# Altium footprint library mobinbyn-Header.PcbLib: 297 footprints (part 11 of 23)
Each footprint in its own frame and in the unit in brackets; x right, y up, seen from the top. Pads: shape width x height; smd on the part's side, far side on the other; paste and mask are expansions set on the pad; w line width, h text height; cw(c..) or ccw(c..) is an arc to the next point about the centre after c.
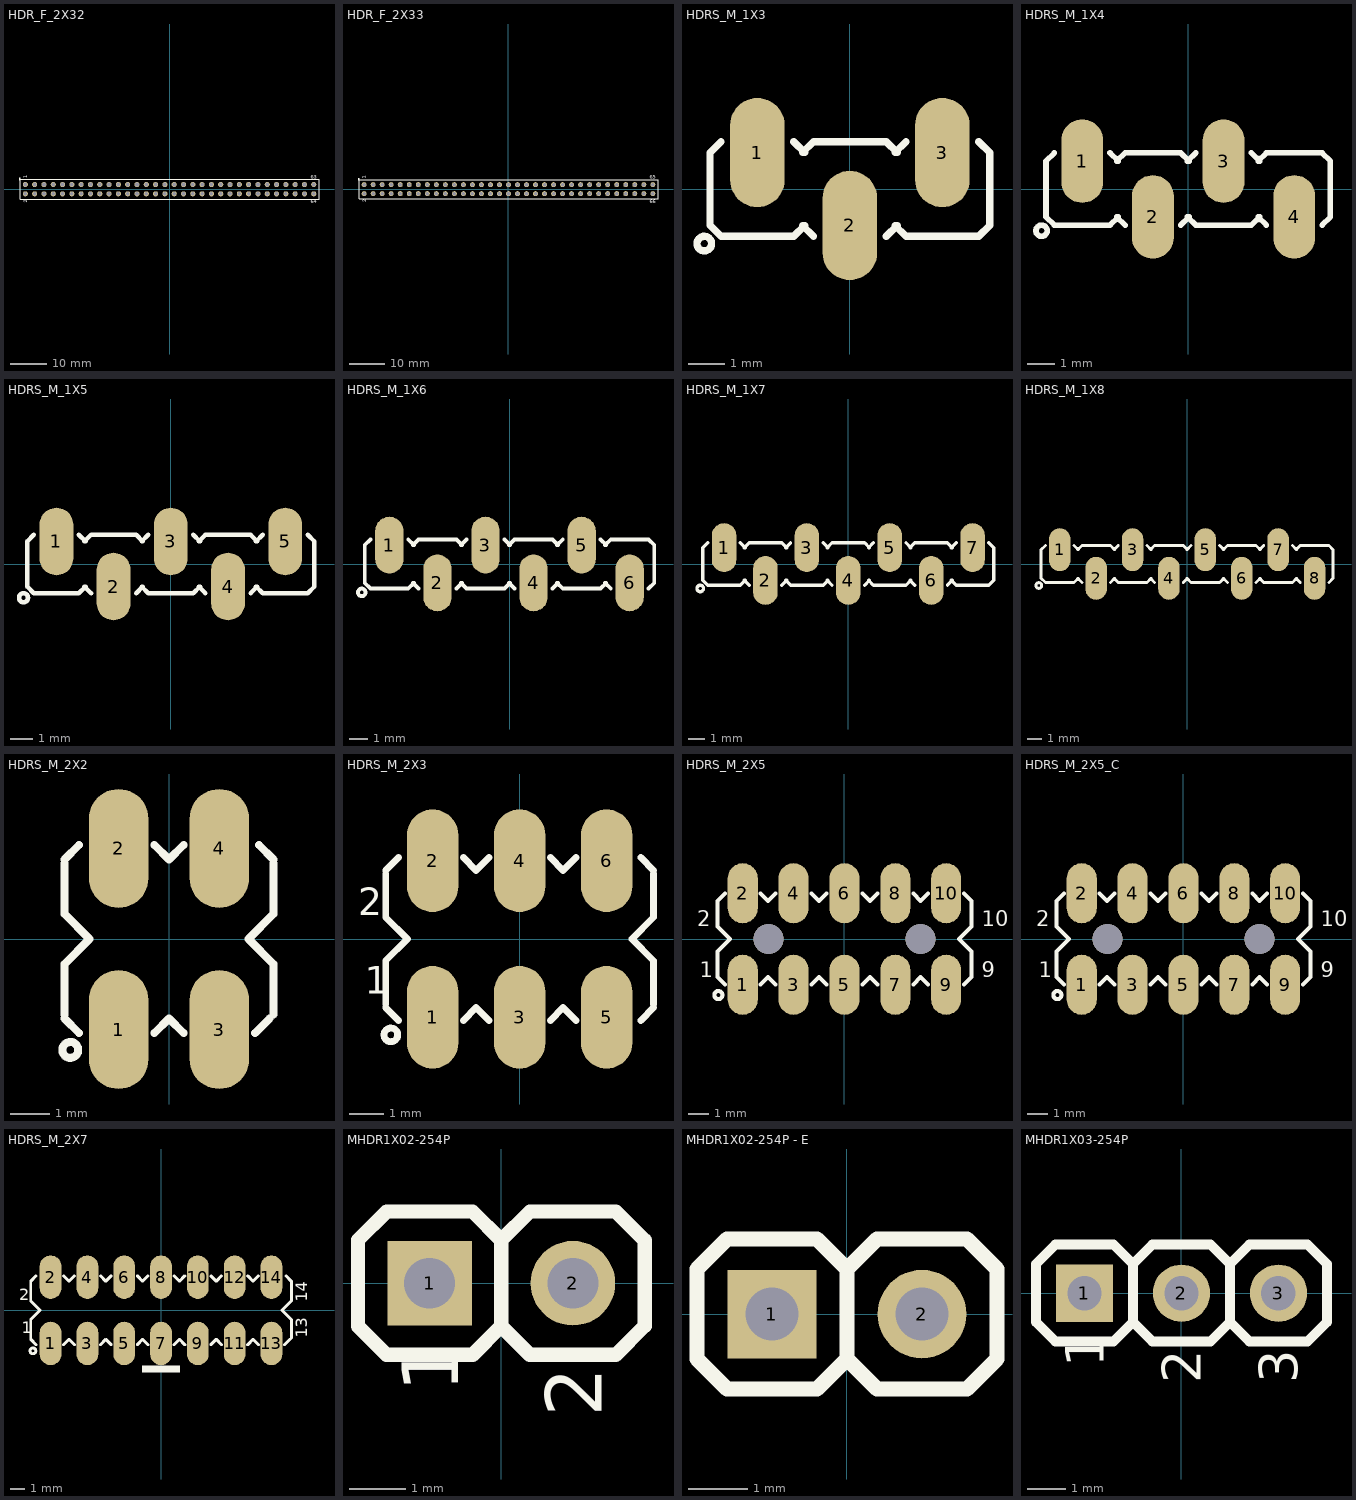
[diagram p10: the footprints below, top view; thin cyan lines are the x and y axes]

## HDR_F_2X32 [mm] "Male Header 2X32 with 2.54 mm Pitch"
pads (64):
  round 1.4 / inner round 1.4 / far side oval 1.4x2.2 hole 1: 1(-39.37,1.27) 2(-39.37,-1.27) 3(-36.83,1.27) 4(-36.83,-1.27) 5(-34.29,1.27) 6(-34.29,-1.27) 7(-31.75,1.27) 8(-31.75,-1.27) 9(-29.21,1.27) 10(-29.21,-1.27) 11(-26.67,1.27) 12(-26.67,-1.27) 13(-24.13,1.27) 14(-24.13,-1.27) 15(-21.59,1.27) 16(-21.59,-1.27) 17(-19.05,1.27) 18(-19.05,-1.27) 19(-16.51,1.27) 20(-16.51,-1.27) 21(-13.97,1.27) 22(-13.97,-1.27) 23(-11.43,1.27) 24(-11.43,-1.27) 25(-8.89,1.27) 26(-8.89,-1.27) 27(-6.35,1.27) 28(-6.35,-1.27) 29(-3.81,1.27) 30(-3.81,-1.27) 31(-1.27,1.27) 32(-1.27,-1.27) 33(1.27,1.27) 34(1.27,-1.27) 35(3.81,1.27) 36(3.81,-1.27) 37(6.35,1.27) 38(6.35,-1.27) 39(8.89,1.27) 40(8.89,-1.27) 41(11.43,1.27) 42(11.43,-1.27) 43(13.97,1.27) 44(13.97,-1.27) 45(16.51,1.27) 46(16.51,-1.27) 47(19.05,1.27) 48(19.05,-1.27) 49(21.59,1.27) 50(21.59,-1.27) 51(24.13,1.27) 52(24.13,-1.27) 53(26.67,1.27) 54(26.67,-1.27) 55(29.21,1.27) 56(29.21,-1.27) 57(31.75,1.27) 58(31.75,-1.27) 59(34.29,1.27) 60(34.29,-1.27) 61(36.83,1.27) 62(36.83,-1.27) 63(39.37,1.27) 64(39.37,-1.27)
Top Overlay:
  circle w0.2: c-40.9,2.8 r0.2
  lines w0.2: -40.8,-2.7 40.8,-2.7 40.8,2.7 -40.8,2.7 -40.8,-2.7
  text "2" at -38.8,-3.7 h1
  text "1" at -38.9,3 h1
  text "64" at 38.6,-3.9 h1
  text "63" at 38.6,2.9 h1
3D body "PBD-2.stp": height 8.5, standoff -3.15, extent 38.1,-2.54 40.64,2.54
3D body "PBD-2.stp": height 8.5, standoff -3.15, extent 33.02,-2.54 35.56,2.54
3D body "PBD-2.stp": height 8.5, standoff -3.15, extent 30.48,-2.54 33.02,2.54
3D body "PBD-2.stp": height 8.5, standoff -3.15, extent 35.56,-2.54 38.1,2.54
3D body "PBD-2.stp": height 8.5, standoff -3.15, extent 25.4,-2.54 27.94,2.54
3D body "PBD-2.stp": height 8.5, standoff -3.15, extent 22.86,-2.54 25.4,2.54
3D body "PBD-2.stp": height 8.5, standoff -3.15, extent 27.94,-2.54 30.48,2.54
3D body "PBD-2.stp": height 8.5, standoff -3.15, extent 20.32,-2.54 22.86,2.54
3D body "PBD-2.stp": height 8.5, standoff -3.15, extent 17.78,-2.54 20.32,2.54
3D body "PBD-2.stp": height 8.5, standoff -3.15, extent 15.24,-2.54 17.78,2.54
3D body "PBD-2.stp": height 8.5, standoff -3.15, extent 12.7,-2.54 15.24,2.54
3D body "PBD-2.stp": height 8.5, standoff -3.15, extent 10.16,-2.54 12.7,2.54
3D body "PBD-2.stp": height 8.5, standoff -3.15, extent 7.62,-2.54 10.16,2.54
3D body "PBD-2.stp": height 8.5, standoff -3.15, extent 5.08,-2.54 7.62,2.54
3D body "PBD-2.stp": height 8.5, standoff -3.15, extent 0,-2.54 2.54,2.54
3D body "PBD-2.stp": height 8.5, standoff -3.15, extent -2.54,-2.54 0,2.54
3D body "PBD-2.stp": height 8.5, standoff -3.15, extent 2.54,-2.54 5.08,2.54
3D body "PBD-2.stp": height 8.5, standoff -3.15, extent -7.62,-2.54 -5.08,2.54
3D body "PBD-2.stp": height 8.5, standoff -3.15, extent -10.16,-2.54 -7.62,2.54
3D body "PBD-2.stp": height 8.5, standoff -3.15, extent -5.08,-2.54 -2.54,2.54
3D body "PBD-2.stp": height 8.5, standoff -3.15, extent -15.24,-2.54 -12.7,2.54
3D body "PBD-2.stp": height 8.5, standoff -3.15, extent -17.78,-2.54 -15.24,2.54
3D body "PBD-2.stp": height 8.5, standoff -3.15, extent -12.7,-2.54 -10.16,2.54
3D body "PBD-2.stp": height 8.5, standoff -3.15, extent -22.86,-2.54 -20.32,2.54
3D body "PBD-2.stp": height 8.5, standoff -3.15, extent -25.4,-2.54 -22.86,2.54
3D body "PBD-2.stp": height 8.5, standoff -3.15, extent -20.32,-2.54 -17.78,2.54
3D body "PBD-2.stp": height 8.5, standoff -3.15, extent -30.48,-2.54 -27.94,2.54
3D body "PBD-2.stp": height 8.5, standoff -3.15, extent -33.02,-2.54 -30.48,2.54
3D body "PBD-2.stp": height 8.5, standoff -3.15, extent -27.94,-2.54 -25.4,2.54
3D body "PBD-2.stp": height 8.5, standoff -3.15, extent -38.1,-2.54 -35.56,2.54
3D body "PBD-2.stp": height 8.5, standoff -3.15, extent -40.64,-2.54 -38.1,2.54
3D body "PBD-2.stp": height 8.5, standoff -3.15, extent -35.56,-2.54 -33.02,2.54

## HDR_F_2X33 [mm] "Male Header 2X32 with 2.54 mm Pitch"
pads (66):
  round 1.4 / inner round 1.4 / far side oval 1.4x2.2 hole 1: 1(-40.64,1.27) 2(-40.64,-1.27) 3(-38.1,1.27) 4(-38.1,-1.27) 5(-35.56,1.27) 6(-35.56,-1.27) 7(-33.02,1.27) 8(-33.02,-1.27) 9(-30.48,1.27) 10(-30.48,-1.27) 11(-27.94,1.27) 12(-27.94,-1.27) 13(-25.4,1.27) 14(-25.4,-1.27) 15(-22.86,1.27) 16(-22.86,-1.27) 17(-20.32,1.27) 18(-20.32,-1.27) 19(-17.78,1.27) 20(-17.78,-1.27) 21(-15.24,1.27) 22(-15.24,-1.27) 23(-12.7,1.27) 24(-12.7,-1.27) 25(-10.16,1.27) 26(-10.16,-1.27) 27(-7.62,1.27) 28(-7.62,-1.27) 29(-5.08,1.27) 30(-5.08,-1.27) 31(-2.54,1.27) 32(-2.54,-1.27) 33(0,1.27) 34(0,-1.27) 35(2.54,1.27) 36(2.54,-1.27) 37(5.08,1.27) 38(5.08,-1.27) 39(7.62,1.27) 40(7.62,-1.27) 41(10.16,1.27) 42(10.16,-1.27) 43(12.7,1.27) 44(12.7,-1.27) 45(15.24,1.27) 46(15.24,-1.27) 47(17.78,1.27) 48(17.78,-1.27) 49(20.32,1.27) 50(20.32,-1.27) 51(22.86,1.27) 52(22.86,-1.27) 53(25.4,1.27) 54(25.4,-1.27) 55(27.94,1.27) 56(27.94,-1.27) 57(30.48,1.27) 58(30.48,-1.27) 59(33.02,1.27) 60(33.02,-1.27) 61(35.56,1.27) 62(35.56,-1.27) 63(38.1,1.27) 64(38.1,-1.27) 65(40.64,1.27) 66(40.64,-1.27)
Top Overlay:
  circle w0.2: c-42.17,2.8 r0.2
  lines w0.2: -42.07,-2.7 -42.07,2.7 42.1,2.7 42.1,-2.7 -42.07,-2.7
  text "65" at 39.83,2.9 h1
  text "66" at 39.83,-3.9 h1
  text "1" at -40.17,3 h1
  text "2" at -40.07,-3.7 h1
3D body "PBD-2.stp": height 8.5, standoff -3.15, extent 39.37,-2.54 41.91,2.54
3D body "PBD-2.stp": height 8.5, standoff -3.15, extent 6.35,-2.54 8.89,2.54
3D body "PBD-2.stp": height 8.5, standoff -3.15, extent 13.97,-2.54 16.51,2.54
3D body "PBD-2.stp": height 8.5, standoff -3.15, extent 21.59,-2.54 24.13,2.54
3D body "PBD-2.stp": height 8.5, standoff -3.15, extent 29.21,-2.54 31.75,2.54
3D body "PBD-2.stp": height 8.5, standoff -3.15, extent -26.67,-2.54 -24.13,2.54
3D body "PBD-2.stp": height 8.5, standoff -3.15, extent -19.05,-2.54 -16.51,2.54
3D body "PBD-2.stp": height 8.5, standoff -3.15, extent -11.43,-2.54 -8.89,2.54
3D body "PBD-2.stp": height 8.5, standoff -3.15, extent -1.27,-2.54 1.27,2.54
3D body "PBD-2.stp": height 8.5, standoff -3.15, extent -41.91,-2.54 -39.37,2.54
3D body "PBD-2.stp": height 8.5, standoff -3.15, extent -34.29,-2.54 -31.75,2.54
3D body "PBD-2.stp": height 8.5, standoff -3.15, extent 34.29,-2.54 36.83,2.54
3D body "PBD-2.stp": height 8.5, standoff -3.15, extent 31.75,-2.54 34.29,2.54
3D body "PBD-2.stp": height 8.5, standoff -3.15, extent 36.83,-2.54 39.37,2.54
3D body "PBD-2.stp": height 8.5, standoff -3.15, extent 26.67,-2.54 29.21,2.54
3D body "PBD-2.stp": height 8.5, standoff -3.15, extent 24.13,-2.54 26.67,2.54
3D body "PBD-2.stp": height 8.5, standoff -3.15, extent 16.51,-2.54 19.05,2.54
3D body "PBD-2.stp": height 8.5, standoff -3.15, extent 19.05,-2.54 21.59,2.54
3D body "PBD-2.stp": height 8.5, standoff -3.15, extent 8.89,-2.54 11.43,2.54
3D body "PBD-2.stp": height 8.5, standoff -3.15, extent 11.43,-2.54 13.97,2.54
3D body "PBD-2.stp": height 8.5, standoff -3.15, extent 1.27,-2.54 3.81,2.54
3D body "PBD-2.stp": height 8.5, standoff -3.15, extent 3.81,-2.54 6.35,2.54
3D body "PBD-2.stp": height 8.5, standoff -3.15, extent -6.35,-2.54 -3.81,2.54
3D body "PBD-2.stp": height 8.5, standoff -3.15, extent -8.89,-2.54 -6.35,2.54
3D body "PBD-2.stp": height 8.5, standoff -3.15, extent -3.81,-2.54 -1.27,2.54
3D body "PBD-2.stp": height 8.5, standoff -3.15, extent -13.97,-2.54 -11.43,2.54
3D body "PBD-2.stp": height 8.5, standoff -3.15, extent -16.51,-2.54 -13.97,2.54
3D body "PBD-2.stp": height 8.5, standoff -3.15, extent -21.59,-2.54 -19.05,2.54
3D body "PBD-2.stp": height 8.5, standoff -3.15, extent -24.13,-2.54 -21.59,2.54
3D body "PBD-2.stp": height 8.5, standoff -3.15, extent -29.21,-2.54 -26.67,2.54
3D body "PBD-2.stp": height 8.5, standoff -3.15, extent -31.75,-2.54 -29.21,2.54
3D body "PBD-2.stp": height 8.5, standoff -3.15, extent -36.83,-2.54 -34.29,2.54
3D body "PBD-2.stp": height 8.5, standoff -3.15, extent -39.37,-2.54 -36.83,2.54

## HDRS_M_1X3 [mm] "Connector; Header; 3 Position, SMD"
pads (3):
  oval 1.5x3 smd: 1(-2.54,1) 2(0,-1) 3(2.54,1)
Top Overlay:
  circle w0.2: c-4,-1.5 r0.2
  lines w0.2: -3.54,1.3 -3.84,1 -3.84,-1 -3.54,-1.3 -1.54,-1.3 -1.24,-1 ; -1.54,1.3 -1.24,1 ; -1.3,-1 -1,-1.3 ; -1.3,1 -1,1.3 1,1.3 1.3,1 ; 1,-1.3 1.3,-1 ; 1.24,-1 1.54,-1.3 3.54,-1.3 3.84,-1 3.84,1 3.54,1.3 ; 1.24,1 1.54,1.3
3D body "HEADER1X3SMD.stp": height 9.68, standoff 0.03, extent -3.81,-2.4 3.81,2.4

## HDRS_M_1X4 [mm] "Connector; Header; 4 Position, SMD"
pads (4):
  oval 1.5x3 smd: 1(-3.81,1) 2(-1.27,-1) 3(1.27,1) 4(3.81,-1)
Top Overlay:
  circle w0.2: c-5.27,-1.5 r0.2
  lines w0.2: -4.81,1.3 -5.11,1 -5.11,-1 -4.81,-1.3 -2.81,-1.3 -2.51,-1 ; -2.81,1.3 -2.51,1 ; -2.57,-1 -2.27,-1.3 ; -2.57,1 -2.27,1.3 -0.27,1.3 0.03,1 ; -0.27,-1.3 0.03,-1 ; -0.03,-1 0.27,-1.3 2.27,-1.3 2.57,-1 ; -0.03,1 0.27,1.3 ; 2.27,1.3 2.57,1 ; 2.51,-1 2.81,-1.3 ; 2.51,1 2.81,1.3 4.81,1.3 5.11,1 5.11,-1 4.81,-1.3
3D body "HEADER1X3SMD.stp": height 9.68, standoff 0.03, extent -5.08,-2.4 2.54,2.4
3D body "HEADER1X3SMD.stp": height 9.68, standoff 0.03, extent -2.54,-2.4 5.08,2.4

## HDRS_M_1X5 [mm] "Connector; Header; 5 Position, SMD"
pads (5):
  oval 1.5x3 smd: 1(-5.08,1) 2(-2.54,-1) 3(0,1) 4(2.54,-1) 5(5.08,1)
Top Overlay:
  circle w0.2: c-6.54,-1.5 r0.2
  lines w0.2: -6.08,1.3 -6.38,1 -6.38,-1 -6.08,-1.3 -4.08,-1.3 -3.78,-1 ; -4.08,1.3 -3.78,1 ; -3.84,-1 -3.54,-1.3 ; -3.84,1 -3.54,1.3 -1.54,1.3 -1.24,1 ; -1.54,-1.3 -1.24,-1 ; -1.3,-1 -1,-1.3 1,-1.3 1.3,-1 ; -1.3,1 -1,1.3 ; 1,1.3 1.3,1 ; 1.24,-1 1.54,-1.3 ; 1.24,1 1.54,1.3 3.54,1.3 3.84,1 ; 3.54,-1.3 3.84,-1 ; 3.78,-1 4.08,-1.3 6.08,-1.3 6.38,-1 6.38,1 6.08,1.3 ; 3.78,1 4.08,1.3
3D body "HEADER1X3SMD.stp": height 9.68, standoff 0.03, extent -3.81,-2.4 3.81,2.4
3D body "HEADER1X3SMD.stp": height 9.68, standoff 0.03, extent -1.27,-2.4 6.35,2.4
3D body "HEADER1X3SMD.stp": height 9.68, standoff 0.03, extent -6.35,-2.4 1.27,2.4

## HDRS_M_1X6 [mm] "Connector; Header; 6 Position, SMD"
pads (6):
  oval 1.5x3 smd: 1(-6.35,1) 2(-3.81,-1) 3(-1.27,1) 4(1.27,-1) 5(3.81,1) 6(6.35,-1)
Top Overlay:
  circle w0.2: c-7.81,-1.5 r0.2
  lines w0.2: -7.35,1.3 -7.65,1 -7.65,-1 -7.35,-1.3 -5.35,-1.3 -5.05,-1 ; -5.35,1.3 -5.05,1 ; -5.11,-1 -4.81,-1.3 ; -5.11,1 -4.81,1.3 -2.81,1.3 -2.51,1 ; -2.81,-1.3 -2.51,-1 ; -2.57,-1 -2.27,-1.3 -0.27,-1.3 0.03,-1 ; -2.57,1 -2.27,1.3 ; -0.27,1.3 0.03,1 ; -0.03,-1 0.27,-1.3 ; -0.03,1 0.27,1.3 2.27,1.3 2.57,1 ; 2.27,-1.3 2.57,-1 ; 2.51,-1 2.81,-1.3 4.81,-1.3 5.11,-1 ; 2.51,1 2.81,1.3 ; 4.81,1.3 5.11,1 ; 5.05,-1 5.35,-1.3 ; 5.05,1 5.35,1.3 7.35,1.3 7.65,1 7.65,-1 7.35,-1.3
3D body "HEADER1X3SMD.stp": height 9.68, standoff 0.03, extent 0,-2.4 7.62,2.4
3D body "HEADER1X3SMD.stp": height 9.68, standoff 0.03, extent -7.62,-2.4 0,2.4

## HDRS_M_1X7 [mm] "Connector; Header; 7 Position, SMD"
pads (7):
  oval 1.5x3 smd: 1(-7.62,1) 2(-5.08,-1) 3(-2.54,1) 4(0,-1) 5(2.54,1) 6(5.08,-1) 7(7.62,1)
Top Overlay:
  circle w0.2: c-9.08,-1.5 r0.2
  lines w0.2: -8.62,1.3 -8.92,1 -8.92,-1 -8.62,-1.3 -6.62,-1.3 -6.32,-1 ; -6.62,1.3 -6.32,1 ; -6.38,-1 -6.08,-1.3 ; -6.38,1 -6.08,1.3 -4.08,1.3 -3.78,1 ; -4.08,-1.3 -3.78,-1 ; -3.84,-1 -3.54,-1.3 -1.54,-1.3 -1.24,-1 ; -3.84,1 -3.54,1.3 ; -1.54,1.3 -1.24,1 ; -1.3,-1 -1,-1.3 ; -1.3,1 -1,1.3 1,1.3 1.3,1 ; 1,-1.3 1.3,-1 ; 1.24,-1 1.54,-1.3 3.54,-1.3 3.84,-1 ; 1.24,1 1.54,1.3 ; 3.54,1.3 3.84,1 ; 3.78,-1 4.08,-1.3 ; 3.78,1 4.08,1.3 6.08,1.3 6.38,1 ; 6.08,-1.3 6.38,-1 ; 6.32,-1 6.62,-1.3 8.62,-1.3 8.92,-1 8.92,1 8.62,1.3 ; 6.32,1 6.62,1.3
3D body "HEADER1X3SMD.stp": height 9.68, standoff 0.03, extent -1.27,-2.4 6.35,2.4
3D body "HEADER1X3SMD.stp": height 9.68, standoff 0.03, extent 1.27,-2.4 8.89,2.4
3D body "HEADER1X3SMD.stp": height 9.68, standoff 0.03, extent -8.89,-2.4 -1.27,2.4

## HDRS_M_1X8 [mm] "Connector; Header; 8 Position, SMD"
pads (8):
  oval 1.5x3 smd: 1(-8.89,1) 2(-6.35,-1) 3(-3.81,1) 4(-1.27,-1) 5(1.27,1) 6(3.81,-1) 7(6.35,1) 8(8.89,-1)
Top Overlay:
  circle w0.2: c-10.35,-1.5 r0.2
  lines w0.2: -9.89,1.3 -10.19,1 -10.19,-1 -9.89,-1.3 -7.89,-1.3 -7.59,-1 ; -7.89,1.3 -7.59,1 ; -7.65,-1 -7.35,-1.3 ; -7.65,1 -7.35,1.3 -5.35,1.3 -5.05,1 ; -5.35,-1.3 -5.05,-1 ; -5.11,-1 -4.81,-1.3 -2.81,-1.3 -2.51,-1 ; -5.11,1 -4.81,1.3 ; -2.81,1.3 -2.51,1 ; -2.57,-1 -2.27,-1.3 ; -2.57,1 -2.27,1.3 -0.27,1.3 0.03,1 ; -0.27,-1.3 0.03,-1 ; -0.03,-1 0.27,-1.3 2.27,-1.3 2.57,-1 ; -0.03,1 0.27,1.3 ; 2.27,1.3 2.57,1 ; 2.51,-1 2.81,-1.3 ; 2.51,1 2.81,1.3 4.81,1.3 5.11,1 ; 4.81,-1.3 5.11,-1 ; 5.05,-1 5.35,-1.3 7.35,-1.3 7.65,-1 ; 5.05,1 5.35,1.3 ; 7.35,1.3 7.65,1 ; 7.59,-1 7.89,-1.3 ; 7.59,1 7.89,1.3 9.89,1.3 10.19,1 10.19,-1 9.89,-1.3
3D body "HEADER1X3SMD.stp": height 9.68, standoff 0.03, extent 2.54,-2.4 10.16,2.4
3D body "HEADER1X3SMD.stp": height 9.68, standoff 0.03, extent 0,-2.4 7.62,2.4
3D body "HEADER1X3SMD.stp": height 9.68, standoff 0.03, extent -7.62,-2.4 0,2.4
3D body "HEADER1X3SMD.stp": height 9.68, standoff 0.03, extent -10.16,-2.4 -2.54,2.4

## HDRS_M_2X2 [mm]
pads (4):
  oval 1.5x3 smd: 1(-1.27,-2.286) 2(-1.27,2.286) 3(1.27,-2.286) 4(1.27,2.286)
Top Overlay:
  circle w0.2: c-2.49,-2.8 r0.2
  lines w0.2: -2.64,-2.005 -2.267,-2.378 ; -2.64,-1.905 -2.64,-0.635 -2.005,0 -2.64,0.635 -2.64,1.905 ; -2.64,2.005 -2.267,2.378 ; -0.373,-2.378 0,-2.005 0.373,-2.378 ; -0.373,2.378 0,2.005 0.373,2.378 ; 2.167,-2.378 2.54,-2.005 ; 2.267,2.378 2.64,2.005 ; 2.64,-1.905 2.64,-0.635 2.005,0 2.64,0.635 2.64,1.905
3D body "HEADER2X2SMD.stp": height 9.54, standoff -0.11, extent -2.54,-3.492 2.54,3.493

## HDRS_M_2X3 [mm] "Connector; Header; 3x2 Position, SMD"
pads (6):
  oval 1.5x3 smd: 1(-2.54,-2.286) 2(-2.54,2.286) 3(0,-2.286) 4(0,2.286) 5(2.54,-2.286) 6(2.54,2.286)
Top Overlay:
  circle w0.2: c-3.76,-2.8 r0.2
  lines w0.2: -3.91,-2.005 -3.537,-2.378 ; -3.91,-1.905 -3.91,-0.635 -3.275,0 -3.91,0.635 -3.91,1.905 ; -3.91,2.005 -3.537,2.378 ; -1.643,-2.378 -1.27,-2.005 -0.897,-2.378 ; -1.643,2.378 -1.27,2.005 -0.897,2.378 ; 0.897,-2.378 1.27,-2.005 1.643,-2.378 ; 0.897,2.378 1.27,2.005 1.643,2.378 ; 3.537,-2.378 3.91,-2.005 ; 3.537,2.378 3.91,2.005 ; 3.91,-1.905 3.91,-0.635 3.275,0 3.91,0.635 3.91,1.905
  text "2" at -4.72,0.7 h0.8
  text "1" at -4.52,-1.6 h0.8
3D body "HEADER2X3SMD.stp": height 9.54, standoff -0.11, extent -3.81,-3.492 3.81,3.493

## HDRS_M_2X5 [mm] "Male Header 2X05 with 2.54 mm SMD"
pads (12):
  oval 1.5x3 smd: 1(-5.08,-2.286) 2(-5.08,2.286) 3(-2.54,-2.286) 4(-2.54,2.286) 5(0,-2.286) 6(0,2.286) 7(2.54,-2.286) 8(2.54,2.286) 9(5.08,-2.286) 10(5.08,2.286)
  round 1.5 hole 1.5 unplated mask+0.038: ""(-3.8,0) ""(3.8,0)
Top Overlay:
  circle w0.2: c-6.3,-2.8 r0.2
  lines w0.2: -5.977,-2.278 -6.35,-1.905 -6.35,-0.635 -5.715,0 -6.35,0.635 -6.35,1.905 -5.977,2.278 ; -4.183,-2.278 -3.81,-1.905 -3.437,-2.278 ; -4.183,2.278 -3.81,1.905 -3.437,2.278 ; -1.643,-2.278 -1.27,-1.905 -0.897,-2.278 ; -1.643,2.278 -1.27,1.905 -0.897,2.278 ; 0.897,-2.278 1.27,-1.905 1.643,-2.278 ; 0.897,2.278 1.27,1.905 1.643,2.278 ; 3.437,-2.278 3.81,-1.905 4.183,-2.278 ; 3.437,2.278 3.81,1.905 4.183,2.278 ; 5.977,-2.278 6.35,-1.905 6.35,-0.635 5.715,0 6.35,0.635 6.35,1.905 5.977,2.278
  text "9" at 6.858,-1.905 h0.76
  text "10" at 6.858,0.635 h0.76
  text "1" at -7.239,-1.905 h0.76
  text "2" at -7.366,0.635 h0.76
3D body "TSM-105-01-X-DV-A.STEP": height 9.65, standoff -1.27, extent -6.35,-3.683 6.35,3.683

## HDRS_M_2X5_C [mm] "Male Header 2X05 with 2.54 mm SMD WITH CABLE"
pads (12):
  oval 1.5x3 smd: 1(-5.08,-2.286) 2(-5.08,2.286) 3(-2.54,-2.286) 4(-2.54,2.286) 5(0,-2.286) 6(0,2.286) 7(2.54,-2.286) 8(2.54,2.286) 9(5.08,-2.286) 10(5.08,2.286)
  round 1.5 hole 1.5 unplated mask+0.038: ""(-3.8,0) ""(3.8,0)
Top Overlay:
  circle w0.2: c-6.3,-2.8 r0.2
  lines w0.2: -5.977,-2.278 -6.35,-1.905 -6.35,-0.635 -5.715,0 -6.35,0.635 -6.35,1.905 -5.977,2.278 ; -4.183,-2.278 -3.81,-1.905 -3.437,-2.278 ; -4.183,2.278 -3.81,1.905 -3.437,2.278 ; -1.643,-2.278 -1.27,-1.905 -0.897,-2.278 ; -1.643,2.278 -1.27,1.905 -0.897,2.278 ; 0.897,-2.278 1.27,-1.905 1.643,-2.278 ; 0.897,2.278 1.27,1.905 1.643,2.278 ; 3.437,-2.278 3.81,-1.905 4.183,-2.278 ; 3.437,2.278 3.81,1.905 4.183,2.278 ; 5.977,-2.278 6.35,-1.905 6.35,-0.635 5.715,0 6.35,0.635 6.35,1.905 5.977,2.278
  text "9" at 6.858,-1.905 h0.76
  text "10" at 6.858,0.635 h0.76
  text "1" at -7.239,-1.905 h0.76
  text "2" at -7.366,0.635 h0.76
3D body "10 Pin (2.5 mm Pitch) IDC Connector.stp": height 76.91, standoff 3.91, extent -8.696,-4.133 8.595,4.265
3D body "TSM-105-01-X-DV-A.STEP": height 9.65, standoff -1.27, extent -6.35,-3.683 6.35,3.683

## HDRS_M_2X7 [mm]
pads (14):
  oval 1.5x3 smd: 1(-7.62,-2.286) 2(-7.62,2.286) 3(-5.08,-2.286) 4(-5.08,2.286) 5(-2.54,-2.286) 6(-2.54,2.286) 7(0,-2.286) 8(0,2.286) 9(2.54,-2.286) 10(2.54,2.286) 11(5.08,-2.286) 12(5.08,2.286) 13(7.62,-2.286) 14(7.62,2.286)
Top Overlay:
  circle w0.2: c-8.84,-2.8 r0.2
  rectangle: -1.3,-4.3 1.3,-3.8
  lines w0.2: -8.99,-2.005 -8.617,-2.378 ; -8.99,-1.905 -8.99,-0.635 -8.355,0 -8.99,0.635 -8.99,1.905 ; -8.99,2.005 -8.617,2.378 ; -6.723,-2.378 -6.35,-2.005 -5.977,-2.378 ; -6.723,2.378 -6.35,2.005 -5.977,2.378 ; -4.183,-2.378 -3.81,-2.005 -3.437,-2.378 ; -4.183,2.378 -3.81,2.005 -3.437,2.378 ; -1.643,-2.378 -1.27,-2.005 -0.897,-2.378 ; -1.643,2.378 -1.27,2.005 -0.897,2.378 ; 0.897,-2.378 1.27,-2.005 1.643,-2.378 ; 0.897,2.378 1.27,2.005 1.643,2.378 ; 3.437,-2.378 3.81,-2.005 4.183,-2.378 ; 3.437,2.378 3.81,2.005 4.183,2.378 ; 5.977,-2.378 6.35,-2.005 6.723,-2.378 ; 5.977,2.378 6.35,2.005 6.723,2.378 ; 8.517,-2.378 8.89,-2.005 ; 8.617,2.378 8.99,2.005 ; 8.99,-1.905 8.99,-0.635 8.355,0 8.99,0.635 8.99,1.905
  text "1" at -9.6,-1.6 h0.8
  text "2" at -9.8,0.7 h0.8
  text "13" at 10.1,-1.9 h0.8
  text "14" at 10.1,0.6 h0.8
3D body "HEADER2X7SMD.stp": height 9.54, standoff -0.11, extent -8.89,-3.492 8.89,3.493

## MHDR1X02-254P [mm] "Male Header 1X02 with 2.54 mm Pitch"
height 8.4
pads (2):
  rect 1.5x1.5 hole 0.9: 1(-1.27,0)
  round 1.5 hole 0.9: 2(1.27,0)
Top Overlay:
  lines w0.254: 0,-0.762 0.507,-1.268 2.032,-1.268 2.54,-0.76 2.54,0.762 2.031,1.272 0.508,1.272 0,0.764 ; -2.54,-0.762 -2.033,-1.268 -0.508,-1.268 0,-0.76 0,0.762 -0.509,1.272 -2.032,1.272 -2.54,0.764 -2.54,-0.762
  text "1" at -0.762,-1.936 h1
  text "2" at 1.778,-2.364 h1
3D body "PIN.STEP": height 8.43, standoff -2.49, extent 0,-1.27 2.54,1.27
3D body "PIN.STEP": height 8.43, standoff -2.49, extent -2.54,-1.27 0,1.27

## MHDR1X02-254P - E [mm] "Male Header 1X02 with 2.54 mm Pitch"
height 8.4
pads (2):
  rect 1.5x1.5 hole 0.9: 1(-1.27,0)
  round 1.5 hole 0.9: 2(1.27,0)
Top Overlay:
  lines w0.254: 0,-0.762 0.507,-1.268 2.032,-1.268 2.54,-0.76 2.54,0.762 2.031,1.272 0.508,1.272 0,0.764 ; -2.54,-0.762 -2.033,-1.268 -0.508,-1.268 0,-0.76 0,0.762 -0.509,1.272 -2.032,1.272 -2.54,0.764 -2.54,-0.762
3D body "PIN.STEP": height 8.43, standoff -2.49, extent 0,-1.27 2.54,1.27
3D body "PIN.STEP": height 8.43, standoff -2.49, extent -2.54,-1.27 0,1.27

## MHDR1X03-254P [mm] "Male Header 1X03 with 2.54 mm Pitch"
height 8.4
pads (3):
  rect 1.5x1.5 hole 0.9: 1(-2.54,0)
  round 1.5 hole 0.9: 2(0,0) 3(2.54,0)
Top Overlay:
  lines w0.254: -1.27,-0.762 -0.763,-1.268 0.762,-1.268 1.27,-0.76 1.27,0.762 0.761,1.272 -0.762,1.272 -1.27,0.764 ; 1.27,-0.762 1.777,-1.268 3.302,-1.268 3.81,-0.76 3.81,0.762 3.301,1.272 1.778,1.272 1.27,0.764 ; -3.81,-0.762 -3.81,0.764 -3.302,1.272 -1.779,1.272 -1.27,0.762 -1.27,-0.76 -1.778,-1.268 -3.303,-1.268 -3.81,-0.762
  text "3" at 3.048,-2.364 h1
  text "2" at 0.508,-2.364 h1
  text "1" at -2.032,-1.936 h1
3D body "PIN.STEP": height 8.43, standoff -2.49, extent 1.27,-1.27 3.81,1.27
3D body "PIN_mid.STEP": height 8.43, standoff -2.49, extent -1.27,-1.27 1.27,1.27
3D body "PIN.STEP": height 8.43, standoff -2.49, extent -3.81,-1.27 -1.27,1.27